# Altium footprint library North POLE.PcbLib: 419 footprints (part 15 of 27)
Each footprint in its own frame and in the unit in brackets; x right, y up, seen from the top. Pads: shape width x height; smd on the part's side, far side on the other; paste and mask are expansions set on the pad; w line width, h text height; cw(c..) or ccw(c..) is an arc to the next point about the centre after c.
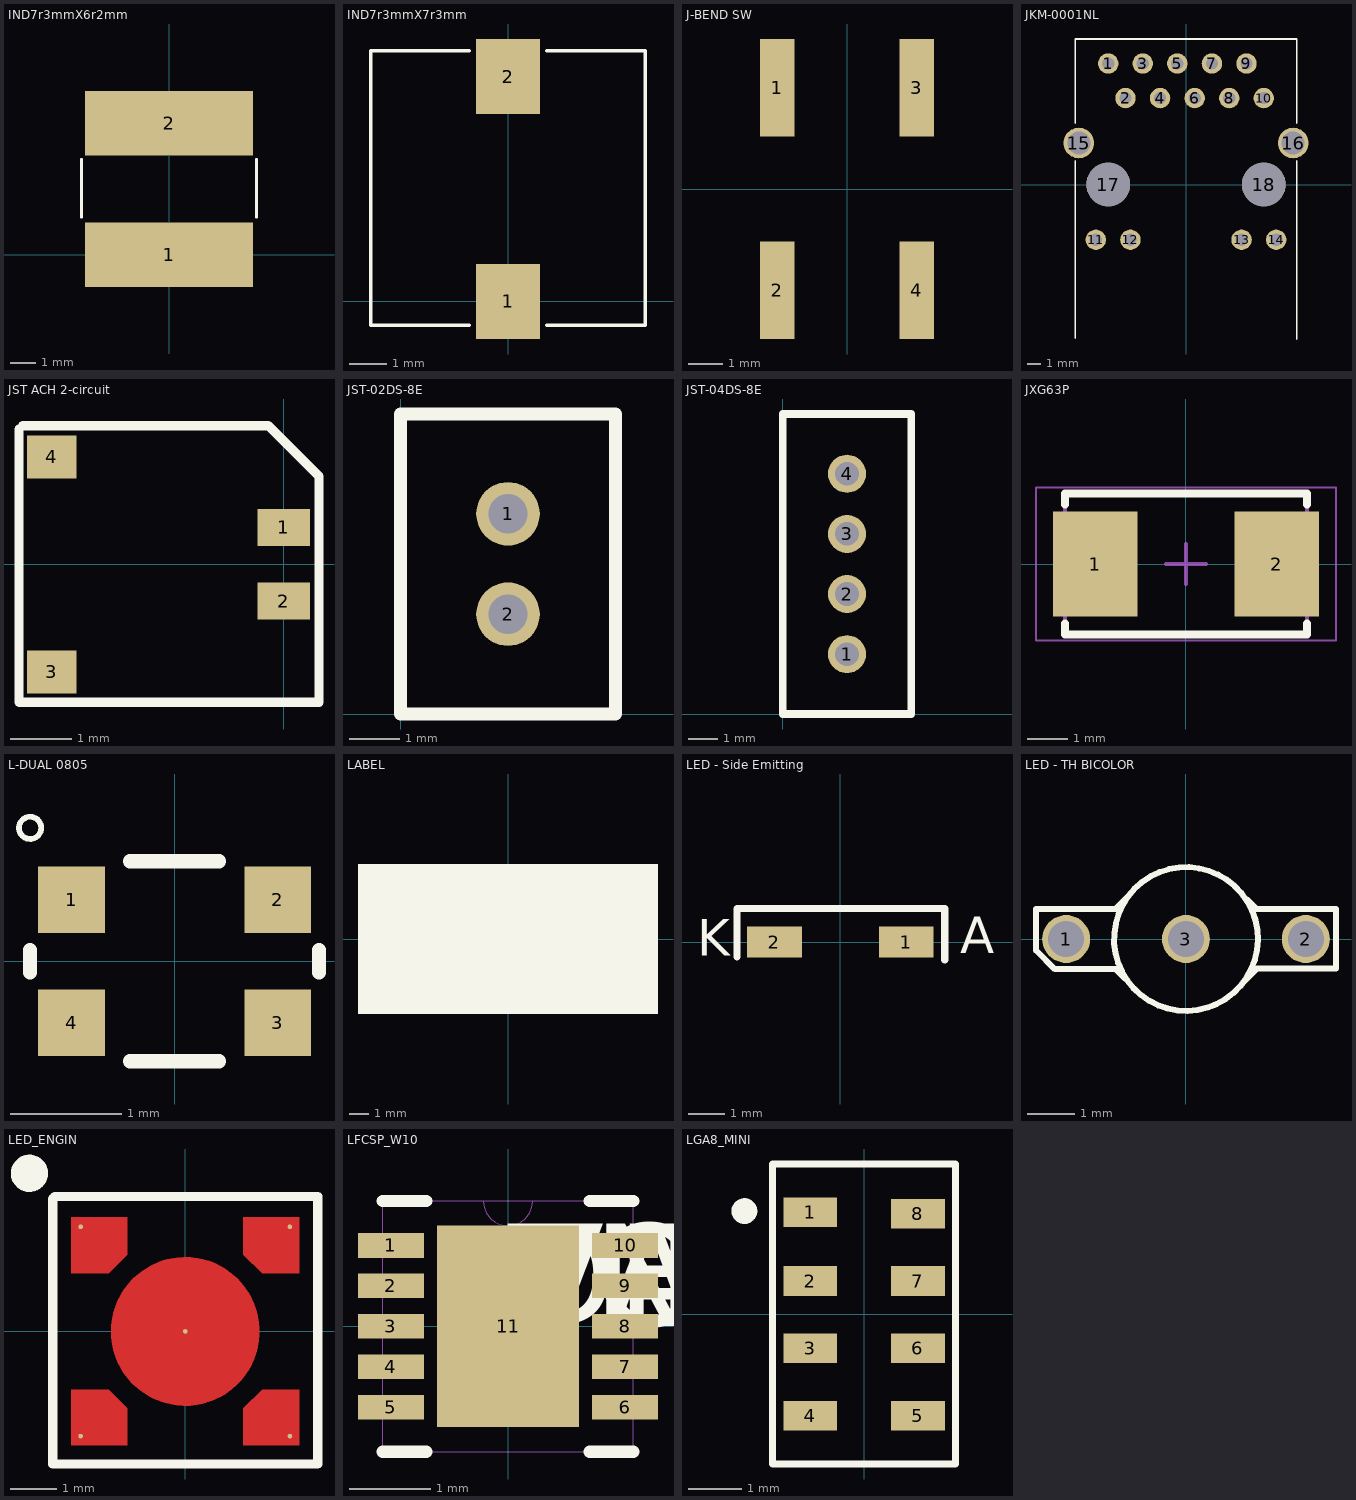
[diagram p14: the footprints below, top view; thin cyan lines are the x and y axes]

## IND7r3mmX6r2mm [mm]
pads (2):
  rect 6.5x2.5 smd: 1(0,0) 2(0,5.08)
Top Overlay:
  lines w0.1: -3.378,1.448 -3.378,3.683 ; 3.378,1.448 3.378,3.683

## IND7r3mmX7r3mm [mm]
pads (2):
  rect 1.7x2 smd: 1(0,0) 2(0,5.994)
Top Overlay:
  lines w0.1: -1.041,-0.635 -3.658,-0.635 -3.658,6.68 -1.041,6.68 ; 1.041,-0.635 3.658,-0.635 3.658,6.68 1.041,6.68

## J-BEND SW [mm]
pads (4):
  rect 1x2.8 smd mask+0.08: 1(-2,2.9) 2(-2,-2.9) 3(2,2.9) 4(2,-2.9)
3D body: height 5.22, standoff 0.02, extent -3.15,-3.4 3.15,3.4

## JKM-0001NL [mm]
pads (18):
  round 1.5 hole 0.9 mask+0.08: 1(-5.715,8.89) 2(-4.445,6.35) 3(-3.175,8.89) 4(-1.905,6.35) 5(-0.635,8.89) 6(0.635,6.35) 7(1.905,8.89) 8(3.175,6.35) 9(4.445,8.89) 10(5.715,6.35) 11(-6.625,-4.06) 12(-4.085,-4.06) 13(4.085,-4.06) 14(6.625,-4.06)
  round 2.25 hole 1.7 mask+0.08: 15(-7.875,3.05) 16(7.875,3.05)
  round 3.2 hole 3.2 unplated mask+0.08: 17(-5.715,0) 18(5.715,0)
Top Overlay:
  lines w0.127: -8.13,-11.303 -8.13,1.727 ; -8.13,4.521 -8.13,10.693 8.13,10.693 8.13,4.521 ; 8.13,-11.354 8.13,1.727
3D body: height 14.8, standoff -3.56, extent -9.338,-11.376 9.338,10.439

## JST ACH 2-circuit [mm]
pads (4):
  rect 0.85x0.6 smd mask+0.08: 1(0,0.6) 2(0,-0.6)
  rect 0.8x0.7 smd mask+0.08: 3(-3.775,-1.75) 4(-3.775,1.75)
Top Overlay:
  lines w0.152: -4.307,2.198 -4.307,-2.24 -4.3,-2.248 0.575,-2.248 0.575,1.432 -0.25,2.258 -4.247,2.258
3D body: height 1.4, standoff -0.05, extent -4.029,-2.1 0.271,2.1

## JST-02DS-8E [mil] "0.156-inch-separation 1x2 header with shroud"
pads (2):
  round 50 hole 31: 1(84.5,157.5) 2(84.5,78.5)
Top Overlay:
  lines w10: 0,0 0,236 169,236 169,0 0,0
3D body: height 137.8, standoff 0, extent 0,0 169,236

## JST-04DS-8E [mil] "0.156-inch-separation 1x2 header with shroud"
pads (4):
  round 50 hole 31: 1(84.5,78.63) 2(84.5,157.63) 3(84.5,236.63) 4(84.5,315.63)
Top Overlay:
  lines w10: 0,0 169,0 169,394.13 0,394.13 0,0
3D body: height 137.8, standoff 0, extent 0,0 169,394.13

## just an origin [mm]

## JXG63P [mm] "SODFL, 2-Leads, Body 3.50x6.60mm, IPC Medium Density"
height 1.3
pads (2):
  rect 2.1x2.6 smd: 1(-2.25,0) 2(2.25,0)
Top Overlay:
  lines w0.2: -3,-1.475 -3,-1.75 3,-1.75 3,-1.475 ; -3,1.475 -3,1.75 3,1.75 3,1.475
Mechanical 13:
  lines w0.1: -3,-1.75 3,-1.75 3,1.75 -3,1.75 -3,-1.75
Mechanical 15:
  lines w0.05: -3.725,-1.9 3.725,-1.9 3.725,1.9 -3.725,1.9 -3.725,-1.9
  lines w0.1: -0.5,0 0.5,0 ; 0,-0.5 0,0.5
3D body: height 1.3, standoff 0, extent -3,-1.75 3,1.75

## L-DUAL 0805 [mm] "Chip Resistor, Body 1.6x0.8mm, IPC Medium Density"
height 0.6
pads (4):
  rect 0.6x0.6 smd: 1(-0.927,0.552) 2(0.927,0.552) 3(0.927,-0.552) 4(-0.927,-0.552)
Top Overlay:
  circle w0.051: c-1.3,1.2 r0.1
  lines w0.127: -1.3,-0.1 -1.3,0.1 ; -0.4,-0.9 0.4,-0.9 ; -0.4,0.9 0.4,0.9 ; 1.3,-0.1 1.3,0.1
Mechanical 4:
  text ".designator" at -2.075,1.8 h1.5

## LABEL [mm]
Top Overlay:
  rectangle: -7.62,-3.81 7.62,3.81

## LED - Side Emitting [mm]
pads (2):
  rect 1.5x0.85 smd: 1(1.8,0) 2(-1.8,0)
Top Overlay:
  lines w0.203: -2.819,-0.406 -2.819,0.914 2.845,0.914 2.845,-0.483
  text "K" at -3.912,-0.381 h1
  text "A" at 3.277,-0.305 h1
3D body: height 0.6, standoff 0, extent -1.905,-0.406 1.905,0.711

## LED - TH BICOLOR [mil]
pads (3):
  round 40 hole 30 mask+1.57: 1(-100,0) 2(100,0) 3(0,0)
Top Overlay:
  lines w5: -50.83,-33.03 -58.7,-25.16 -109.49,-25.16 -125.16,-9.49 -125.16,25.2 -58.66,25.2 -48.98,34.88 ; 48.98,-34.88 59.13,-24.72 125.2,-24.72 125.2,25.2 58.66,25.2 50.83,33.03 ; 51.02,31.57 ccw(c0,0) 51.42,30.92
3D body: height 241.26, standoff -287.48, extent -86.17,-83 91,74.48

## LED_ENGIN [mm]
pads (5):
  round 0.1 smd: 1(-2.25,2.25) 5(0,0)
  round 0.1 all layers, no hole: 2(2.25,2.25) 3(2.25,-2.25) 4(-2.25,-2.25)
Top Layer:
  circle w1.6: c0,0 r0.8
  region: 2.45,-2.45 2.45,-1.25 1.65,-1.25 1.25,-1.65 1.25,-2.45
  region: 2.45,2.45 2.45,1.25 1.65,1.25 1.25,1.65 1.25,2.45
  region: -2.45,-2.45 -2.45,-1.25 -1.65,-1.25 -1.25,-1.65 -1.25,-2.45
  region: -2.45,2.45 -1.25,2.45 -1.25,1.65 -1.65,1.25 -2.45,1.25
Top Overlay:
  circle w0.4: c-3.35,3.4 r0.2
  lines w0.2: -2.85,-2.85 2.85,-2.85 2.85,2.9 -2.8,2.9 -2.85,2.85 -2.85,-2.85
Top Paste:
  circle w1.6: c0,0 r0.75
  region: -2.4,2.4 -1.3,2.4 -1.3,1.7 -1.7,1.3 -2.4,1.3
  region: 2.4,2.4 2.4,1.3 1.7,1.3 1.3,1.7 1.3,2.4
  region: -2.4,-2.4 -2.4,-1.3 -1.7,-1.3 -1.3,-1.7 -1.3,-2.4
  region: 2.4,-2.4 1.3,-2.4 1.3,-1.7 1.7,-1.3 2.4,-1.3
Top Solder:
  circle w1.6: c0,0 r0.85
  region: -2.5,2.5 -1.2,2.5 -1.2,1.6 -1.6,1.2 -2.5,1.2
  region: 2.5,2.5 2.5,1.2 1.6,1.2 1.2,1.6 1.2,2.5
  region: 2.5,-2.5 1.2,-2.5 1.2,-1.6 1.6,-1.2 2.5,-1.2
  region: -2.5,-2.5 -2.5,-1.2 -1.6,-1.2 -1.2,-1.6 -1.2,-2.5

## LFCSP_W10 [mil] "10-Lead Lead Frame Chip Scale Package [LFCSP_WD]  3 mm x 3 mm Body, Very Very Thin, Dual Lead  (CP-10-9)"
height 31.5
pads (11):
  rect 32x12 smd mask+4: 1(-57,39.37) 2(-57,19.68) 3(-57,0) 4(-57,-19.68) 5(-57,-39.37) 6(57,-39.37) 7(57,-19.68) 8(57,0) 9(57,19.68) 10(57,39.37)
  rect 69x98 smd: 11(0,0)
Top Overlay:
  lines w6: -61,-61 -39.75,-61 ; -61,61 -39.75,61 ; 39.75,-61 61,-61 ; 39.75,61 61,61
  text "PN" at 0,0 h50
  text "DEV" at 0,0 h50
  text "VAL" at 0,0 h50
  text "TOL" at 0,0 h50
Mechanical 1:
  lines w0: -12,61 ccw(c0,61) 12,61 ; -61,-61 61,-61 61,61 -61,61 -61,-61
  text "RefDes2" at 0,0 h50

## LGA8_MINI [mm]
height 1.2
pads (8):
  rect 1x0.55 smd: 1(-1,1.888) 2(-1,0.613) 3(-1,-0.637) 4(-1,-1.887) 5(1,-1.887) 6(1,-0.637) 7(1,0.613) 8(1,1.863)
Top Overlay:
  circle w0.254: c-2.225,1.913 r0.112
  lines w0.127: -1.7,-2.787 -1.7,2.788 1.7,2.788 1.7,-2.787 -1.7,-2.787
3D body: height 1.2, standoff 0, extent -1.475,-2.662 1.475,2.663